# Altium footprint library Altium_Lib.PcbLib: 334 footprints (part 17 of 21)
Each footprint in its own frame and in the unit in brackets; x right, y up, seen from the top. Pads: shape width x height; smd on the part's side, far side on the other; paste and mask are expansions set on the pad; w line width, h text height; cw(c..) or ccw(c..) is an arc to the next point about the centre after c.
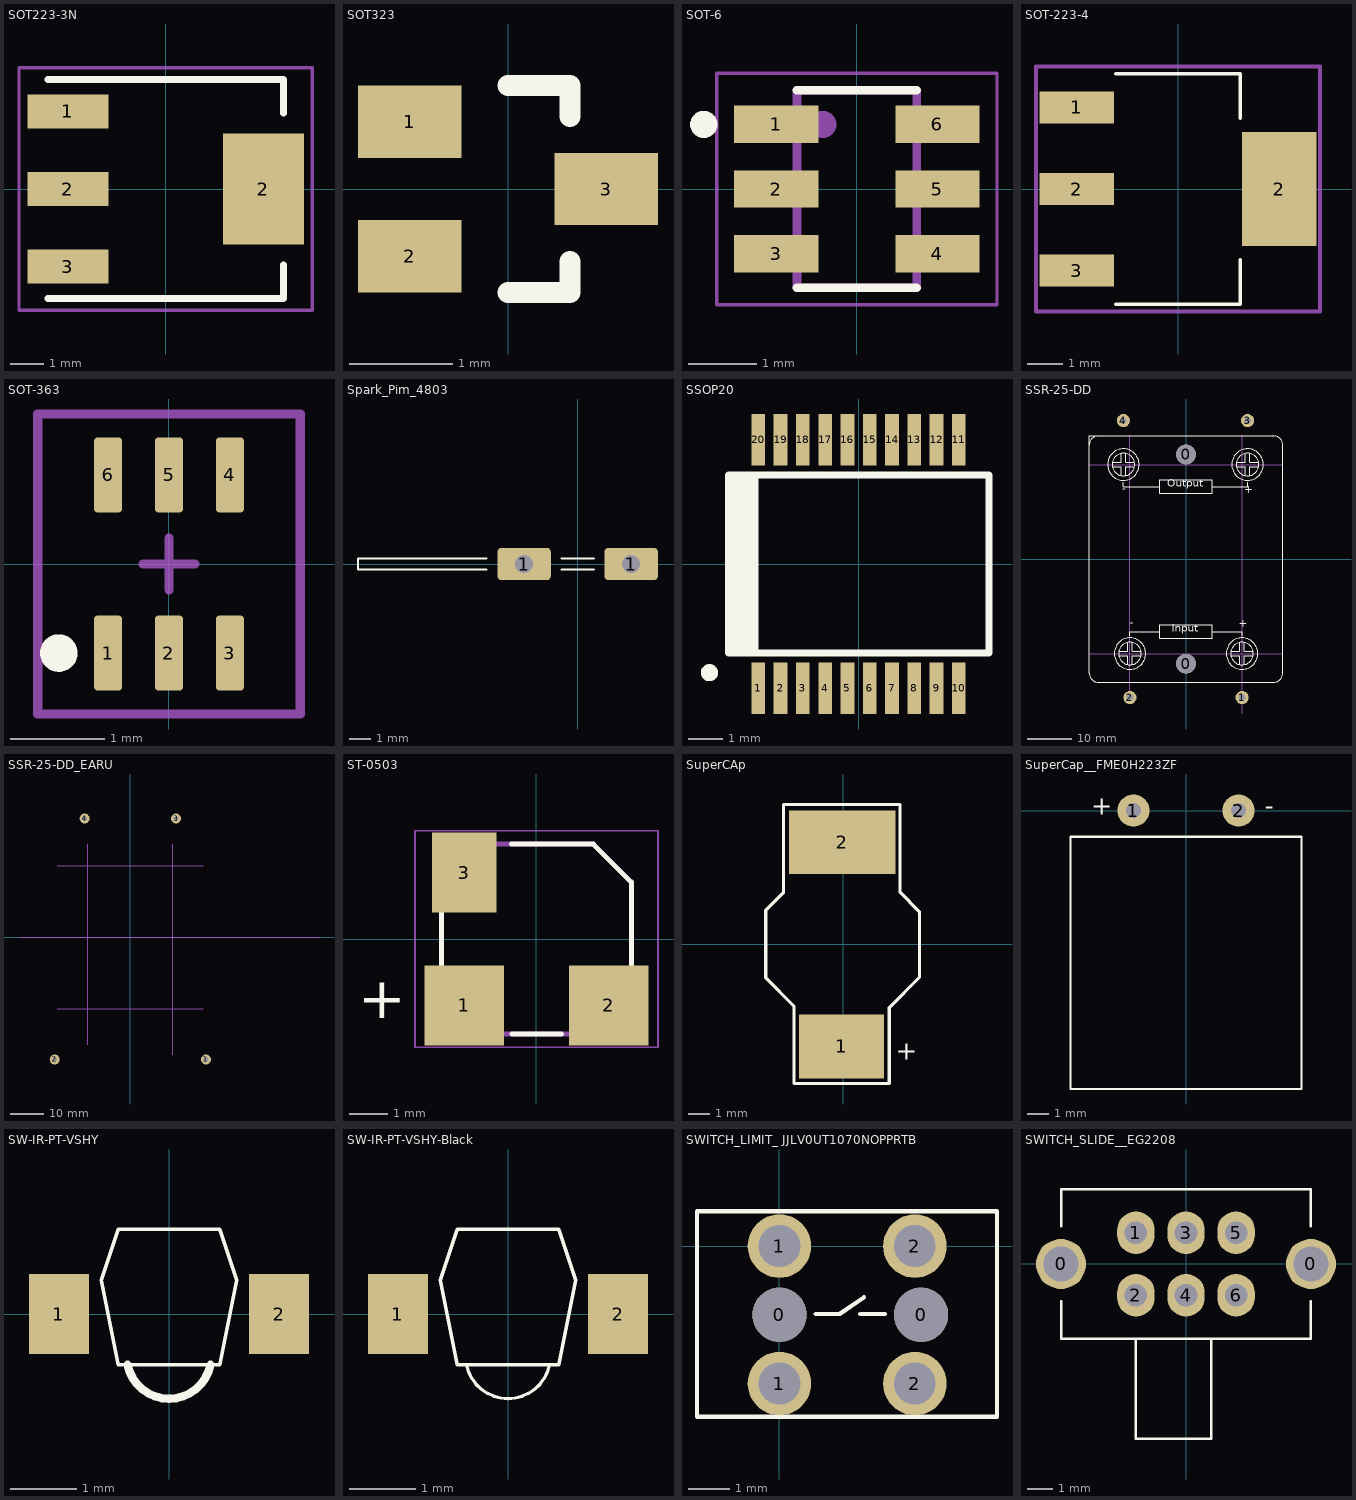
[diagram p16: the footprints below, top view; thin cyan lines are the x and y axes]

## SOT223-3N [mm] "SOT223/SC73, 4-Leads, Body 6.5x3.5mm, Pitch 2.3mm, Lead Span 7mm, IPC Medium Density"
height 1.8
pads (4):
  rect 2.4x1 smd: 1(-2.9,2.3) 2(-2.9,0) 3(-2.9,-2.3)
  rect 2.4x3.3 smd: 2(2.9,0)
Top Overlay:
  lines w0.2: -3.5,-3.25 3.5,-3.25 3.5,-2.25 ; -3.5,3.25 3.5,3.25 3.5,2.25
Mechanical 15:
  lines w0.1: -4.35,-3.6 4.35,-3.6 4.35,3.6 -4.35,3.6 -4.35,-3.6
3D body "SOT_223_3.step": height 1.68, standoff -0.01, extent -3.48,-3.25 3.48,3.25

## SOT323 [mm]
pads (3):
  rect 1x0.7 smd: 1(-0.95,0.65) 2(-0.95,-0.65) 3(0.95,0)
Top Overlay:
  lines w0.2: 0,-1 0.6,-1 0.6,-0.7 ; 0,1 0.6,1 0.6,0.7
3D body "User Library-sc70-3.STEP": height 1, standoff 0, extent -1.15,-1.05 1.15,1.05

## SOT-6 [mm]
pads (6):
  rect 1.24x0.55 smd: 1(-1.185,0.95) 2(-1.185,0) 3(-1.185,-0.95) 4(1.185,-0.95) 5(1.185,0) 6(1.185,0.95)
Top Overlay:
  circle w0.2: c-2.25,0.95 r0.1
  lines w0.127: -0.88,-1.45 0.88,-1.45 ; -0.88,1.45 0.88,1.45
Mechanical 13:
  circle w0.2: c-0.5,0.95 r0.1
  lines w0.127: -0.88,-1.45 0.88,-1.45 0.88,1.45 -0.88,1.45 -0.88,-1.45
Mechanical 15:
  lines w0.05: -2.06,-1.7 2.06,-1.7 2.06,1.7 -2.06,1.7 -2.06,-1.7
3D body "LTC3426ES6#TRMPBF.STEP": height 1, standoff 0, extent -1.4,-1.45 1.4,1.45

## SOT-223-4 [mm] "SOT223/SC73, 4-Leads, Body 6.5x3.5mm, Pitch 2.3mm, Lead Span 7mm, IPC High Density"
height 1.8
pads (4):
  rect 2.1x0.9 smd: 1(-2.85,2.3) 2(-2.85,0) 3(-2.85,-2.3)
  rect 2.1x3.2 smd: 2(2.85,0)
Top Overlay:
  lines w0.1: -1.75,-3.25 1.75,-3.25 1.75,-2 ; -1.75,3.25 1.75,3.25 1.75,2
Mechanical 15:
  lines w0.1: -4,-3.45 -4,3.45 4,3.45 4,-3.45 -4,-3.45
3D body "SOT_223_3.step": height 1.68, standoff -0.01, extent -3.48,-3.25 3.48,3.25

## SOT-363 [mm]
pads (6):
  rrect25% 0.3x0.8 smd mask+0.051: 1(-0.65,-0.95) 2(0,-0.95) 3(0.65,-0.95) 4(0.65,0.95) 5(0,0.95) 6(-0.65,0.95)
Top Overlay:
  circle w0.2: c-1.175,-0.95 r0.1
Mechanical 15:
  lines w0.1: -0.275,0 0.275,0 ; 0,-0.275 0,0.275 ; -1.4,-1.6 -1.4,1.6 1.4,1.6 1.4,-1.6 -1.4,-1.6
3D body "SOT_363.step": height 1, standoff 0, extent -1.05,-1.15 1.05,1.15

## Spark_Pim_4803 [mm]
pads (2):
  rrect25% 2.5x1.5 hole 0.84 square: 1(-2.5,0) 1(2.5,0)
Top Overlay:
  lines w0.1: -4.25,-0.25 -10.25,-0.25 -10.25,0.25 -4.25,0.25 ; -0.75,-0.25 0.75,-0.25 ; -0.75,0.25 0.75,0.25
3D body "terminal 90derece.STEP": height 7.42, standoff -3.63, extent -10.22,-0.29 3.11,0.25

## SSOP20 [mm]
pads (20):
  rect 0.4x1.5 smd: 1(-2.925,-3.625) 2(-2.275,-3.625) 3(-1.625,-3.625) 4(-0.975,-3.625) 5(-0.325,-3.625) 6(0.325,-3.625) 7(0.975,-3.625) 8(1.625,-3.625) 9(2.275,-3.625) 10(2.925,-3.625) 11(2.925,3.625) 12(2.275,3.625) 13(1.625,3.625) 14(0.975,3.625) 15(0.325,3.625) 16(-0.325,3.625) 17(-0.975,3.625) 18(-1.625,3.625) 19(-2.275,3.625) 20(-2.925,3.625)
Top Overlay:
  circle w0.25: c-4.35,-3.17 r0.125
  rectangle: -3.9,-2.6 -2.925,2.6
  lines w0.203: -3.8,-2.6 3.8,-2.6 3.8,2.6 -3.8,2.6
3D body "User Library-SSOP 20 PIN-1.STEP": height 1.98, standoff -0.01, extent -3.665,-3.95 3.665,3.95

## SSR-25-DD [mm]
pads (6):
  round 4.5 hole 4.5 unplated mask+0.05: 0(0,-23.8) 0(0,23.8)
  round 3 hole 1.5 mask+0.05: 1(12.75,-31.5) 2(-12.75,-31.5) 3(14,31.5) 4(-14.25,31.5)
Top Overlay:
  circle w0.2: c14,21.5 r2.574
  circle w0.2: c14,21.5 r3.579
  circle w0.2: c-14.25,21.5 r3.579
  circle w0.2: c-14.25,21.5 r2.574
  circle w0.2: c-12.75,-21.5 r3.579
  circle w0.2: c-12.75,-21.5 r2.574
  circle w0.2: c12.75,-21.5 r2.574
  circle w0.2: c12.75,-21.5 r3.579
  lines w0.2: -22,26 cw(c-20,26) -20,28 ; -16.75,21 -14.75,21 -14.75,19 ; -16.75,22 -14.75,22 -14.75,24 ; -15.25,-22 -13.25,-22 -13.25,-24 ; -15.25,-21 -13.25,-21 -13.25,-19 ; -14.25,17.5 -14.25,16.5 -6,16.5 ; -13.75,19 -13.75,21 -11.75,21 ; -13.75,24 -13.75,22 -11.75,22 ; -12.75,-17.5 -12.75,-16.5 -6,-16.5 ; -12.25,-24 -12.25,-22 -10.25,-22 ; -12.25,-19 -12.25,-21 -10.25,-21 ; 6,-16.5 12.75,-16.5 12.75,-17.5 ; 6,16.5 14,16.5 14,17.5 ; 10.25,-22 12.25,-22 12.25,-24 ; 10.25,-21 12.25,-21 12.25,-19 ; 11.5,21 13.5,21 13.5,19 ; 11.5,22 13.5,22 13.5,24 ; 13.25,-24 13.25,-22 15.25,-22 ; 13.25,-19 13.25,-21 15.25,-21 ; 14.5,19 14.5,21 16.5,21 ; 14.5,24 14.5,22 16.5,22 ; -22,-26 ccw(c-20,-26) -20,-28 20,-28 ccw(c20,-26) 22,-26 22,26 ccw(c20,26) 20,28 -22,28 -22,-26 ; -6,-18 6,-18 6,-15 -6,-15 -6,-18 ; -6,15 -6,18 6,18 6,15 -6,15
  text "-" at -12.75,-16 h3
  text "-" at -14.5,14.5 h3
  text "+" at 13.25,14.25 h3
  text "+" at 12,-16.25 h3
  text "Output" at -4.25,15.75 h3
  text "Input" at -3.25,-17.25 h3
Mechanical 27:
  lines w0.2: -22,-21.5 22,-21.5 ; -22,21.5 22,21.5 ; -12.75,-32.25 -12.75,28 ; 12.75,-35.25 12.75,28
3D body "30390.stp": height 26.32, standoff 0.7, extent -22.577,-28.575 22.077,28.575

## SSR-25-DD_EARU [mm]
pads (4):
  round 3 hole 1.5 mask+0.05: 1(22.75,-36.75) 2(-22.75,-36.75) 3(13.75,35.75) 4(-13.75,35.75)
Bottom Overlay:
  circle w0.2: c14,21.5 r2.574
  circle w0.2: c14,21.5 r3.579
  circle w0.2: c-14.25,21.5 r3.579
  circle w0.2: c-14.25,21.5 r2.574
  circle w0.2: c-12.75,-21.5 r3.579
  circle w0.2: c-12.75,-21.5 r2.574
  circle w0.2: c12.75,-21.5 r2.574
  circle w0.2: c12.75,-21.5 r3.579
  lines w0.2: -16.75,21 -14.75,21 -14.75,19 ; -16.75,22 -14.75,22 -14.75,24 ; -15.25,-22 -13.25,-22 -13.25,-24 ; -15.25,-21 -13.25,-21 -13.25,-19 ; -14.25,17.5 -14.25,16.5 -6,16.5 ; -13.75,19 -13.75,21 -11.75,21 ; -13.75,24 -13.75,22 -11.75,22 ; -12.75,-17.5 -12.75,-16.5 -6,-16.5 ; -12.25,-24 -12.25,-22 -10.25,-22 ; -12.25,-19 -12.25,-21 -10.25,-21 ; 6,-16.5 12.75,-16.5 12.75,-17.5 ; 6,16.5 14,16.5 14,17.5 ; 10.25,-22 12.25,-22 12.25,-24 ; 10.25,-21 12.25,-21 12.25,-19 ; 11.5,21 13.5,21 13.5,19 ; 11.5,22 13.5,22 13.5,24 ; 13.25,-24 13.25,-22 15.25,-22 ; 13.25,-19 13.25,-21 15.25,-21 ; 14.5,19 14.5,21 16.5,21 ; 14.5,24 14.5,22 16.5,22 ; -22,-29.5 ccw(c-20,-29.5) -20,-31.5 20,-31.5 ccw(c20,-29.5) 22,-29.5 22,29.5 ccw(c20,29.5) 20,31.5 -20,31.5 ccw(c-20,29.5) -22,29.5 -22,-29.5 ; -6,-18 6,-18 6,-15 -6,-15 -6,-18 ; -6,15 -6,18 6,18 6,15 -6,15
  text "Output" at -4.25,15.75 h3
  text "Input" at -3.25,-17.25 h3
  text "-" at -12.75,-16 h3
  text "-" at -14.5,14.5 h3
  text "+" at 13.25,14.25 h3
  text "+" at 12,-16.25 h3
Mechanical 15:
  lines w0.2: -33.5,0 56.75,0
Mechanical 27:
  lines w0.2: -22,-21.5 22,-21.5 ; -22,21.5 22,21.5 ; -12.75,-32.25 -12.75,28 ; 12.75,-35.25 12.75,28
3D body "30390.stp": height -2.68, standoff -28.3, extent -22.577,-28.575 22.077,28.575

## ST-0503 [mm]
pads (3):
  rect 2.1x2.1 smd: 1(-1.9,-1.75) 2(1.9,-1.75)
  rect 1.7x2.1 smd: 3(-1.9,1.75)
Top Overlay:
  lines w0.127: -2.5,-0.71 -2.5,0.71 ; -0.66,2.5 1.5,2.5 2.5,1.5 2.5,-0.7 ; -0.65,-2.5 0.66,-2.5
  text "+" at -4.7,-2.45 h1.88
Mechanical 4:
  lines w0.127: -2.5,-2.5 2.5,-2.5 ; -2.5,-2.5 -2.5,2.5 ; -2.5,-2.5 2.5,-2.5 ; -2.5,-2.5 -2.5,2.5 ; -2.5,2.5 1.5,2.5 ; -2.5,2.5 1.5,2.5 ; 1.5,2.5 2.5,1.5 ; 1.5,2.5 2.5,1.5 ; 2.5,-2.5 2.5,1.5 ; 2.5,-2.5 2.5,1.5
Mechanical 16:
  lines w0.05: -3.2,-2.85 3.2,-2.85 3.2,2.85 -3.2,2.85 -3.2,-2.85
3D body "ST-0503.step": height 2.9, standoff -0.01, extent -2.6,-2.625 2.6,2.575

## SuperCAp [mm]
pads (2):
  rect 4x3 smd: 1(-0.073,-4.8)
  rect 5x3 smd: 2(-0.038,4.8)
Top Overlay:
  lines w0.15: -3.639,-1.58 -2.308,-2.911 -2.308,-6.539 2.164,-6.539 2.164,-2.98 3.585,-1.559 3.585,1.539 2.68,2.444 2.68,6.565 -2.795,6.565 -2.795,2.446 -3.639,1.602 -3.639,-1.58
  text "+" at 2.48,-5.731 h1.52
3D body "DSK-3R3H224U-HL--3DModel-STEP-56544.STEP": height 3, standoff 0, extent -3.414,-5.896 3.386,5.804

## SuperCap__FME0H223ZF [mm]
pads (2):
  round 1.524 hole 0.7: 1(-2.5,0) 2(2.5,0)
Top Overlay:
  lines w0.1: -5.5,-13.25 5.5,-13.25 5.5,-1.25 -3.75,-1.25 -5.5,-1.25 -5.5,-13.25
  text "-" at 3.75,-0.5 h1.52
  text "+" at -4.5,-0.5 h1.52
3D body "FM0H223ZF_90DEGRE.STEP": height 5.51, standoff -2.5, extent -5.5,-13.25 5.5,0.25

## SW-IR-PT-VSHY [mm]
pads (2):
  rect 0.9x1.2 smd: 1(-1.65,0) 2(1.65,0)
Top Overlay:
  lines w0.05: -1.016,0.508 -0.762,-0.762 -0.635,-0.762 0.635,-0.762 0.762,-0.762 1.016,0.508 0.762,1.27 -0.762,1.27 -1.016,0.508
  lines w0.127: -0.623,-0.76 ccw(c0,-0.635) 0.623,-0.76
3D body "User Library-VEMT2523SLX01 Silicon phototransistor.STEP": height 2.32, standoff -0.02, extent -1.9,-1.242 1.9,1.308

## SW-IR-PT-VSHY-Black [mm]
pads (2):
  rect 0.9x1.2 smd: 1(-1.65,0) 2(1.65,0)
Top Overlay:
  lines w0.05: -0.623,-0.76 ccw(c0,-0.635) 0.623,-0.76 ; -1.016,0.508 -0.762,-0.762 -0.635,-0.762 0.635,-0.762 0.762,-0.762 1.016,0.508 0.762,1.27 -0.762,1.27 -1.016,0.508
3D body "User Library-VEMT2523SLX01 Silicon phototransistor.STEP": height 2.32, standoff -0.02, extent -1.9,-1.275 1.9,1.275

## SWITCH_LIMIT_ JJLV0UT1070NOPPRTB [mm] "SWITCH DETECTOR SPST-NO 5MA 5V"
pads (6):
  round 1.3 hole 1.3: 0(0,-1.65) 0(3.4,-1.65)
  round 1.524 hole 1: 1(0,-3.3) 1(0,0) 2(3.25,-3.3) 2(3.25,0)
Top Overlay:
  lines w0.1: 0.87,-1.63 1.44,-1.63 2.03,-1.23 ; 1.94,-1.63 2.53,-1.63 ; -1.98,-4.095 -1.98,0.835 5.22,0.835 5.22,-4.095 -1.98,-4.095
3D body "c-2331396-1-a-3d.stp": height 10.7, standoff -2.6, extent -1.68,-3.795 4.92,0.535

## SWITCH_SLIDE__EG2208 [mm]
pads (8):
  round 2 hole 1.4: 0(-5,0) 0(5,0)
  oval 1.5x1.7 hole 0.9: 1(-2,1.25) 2(-2,-1.25) 3(0,1.25) 4(0,-1.25) 5(2,1.25) 6(2,-1.25)
Top Overlay:
  lines w0.1: -5,-1.5 -5,-3 5,-3 5,-1.5 ; -5,1.5 -5,3 5,3 5,1.5 ; -2,-3 -2,-7 -0.25,-7 1,-7 1,-3
3D body "EG2208.stp": height 2.33, standoff -5.67, extent -5.15,-7 5.15,3